# Altium footprint library con-molex.PCBLIB: 369 footprints (part 9 of 26)
Each footprint in its own frame and in the unit in brackets; x right, y up, seen from the top. Pads: shape width x height; smd on the part's side, far side on the other; paste and mask are expansions set on the pad; w line width, h text height; cw(c..) or ccw(c..) is an arc to the next point about the centre after c.
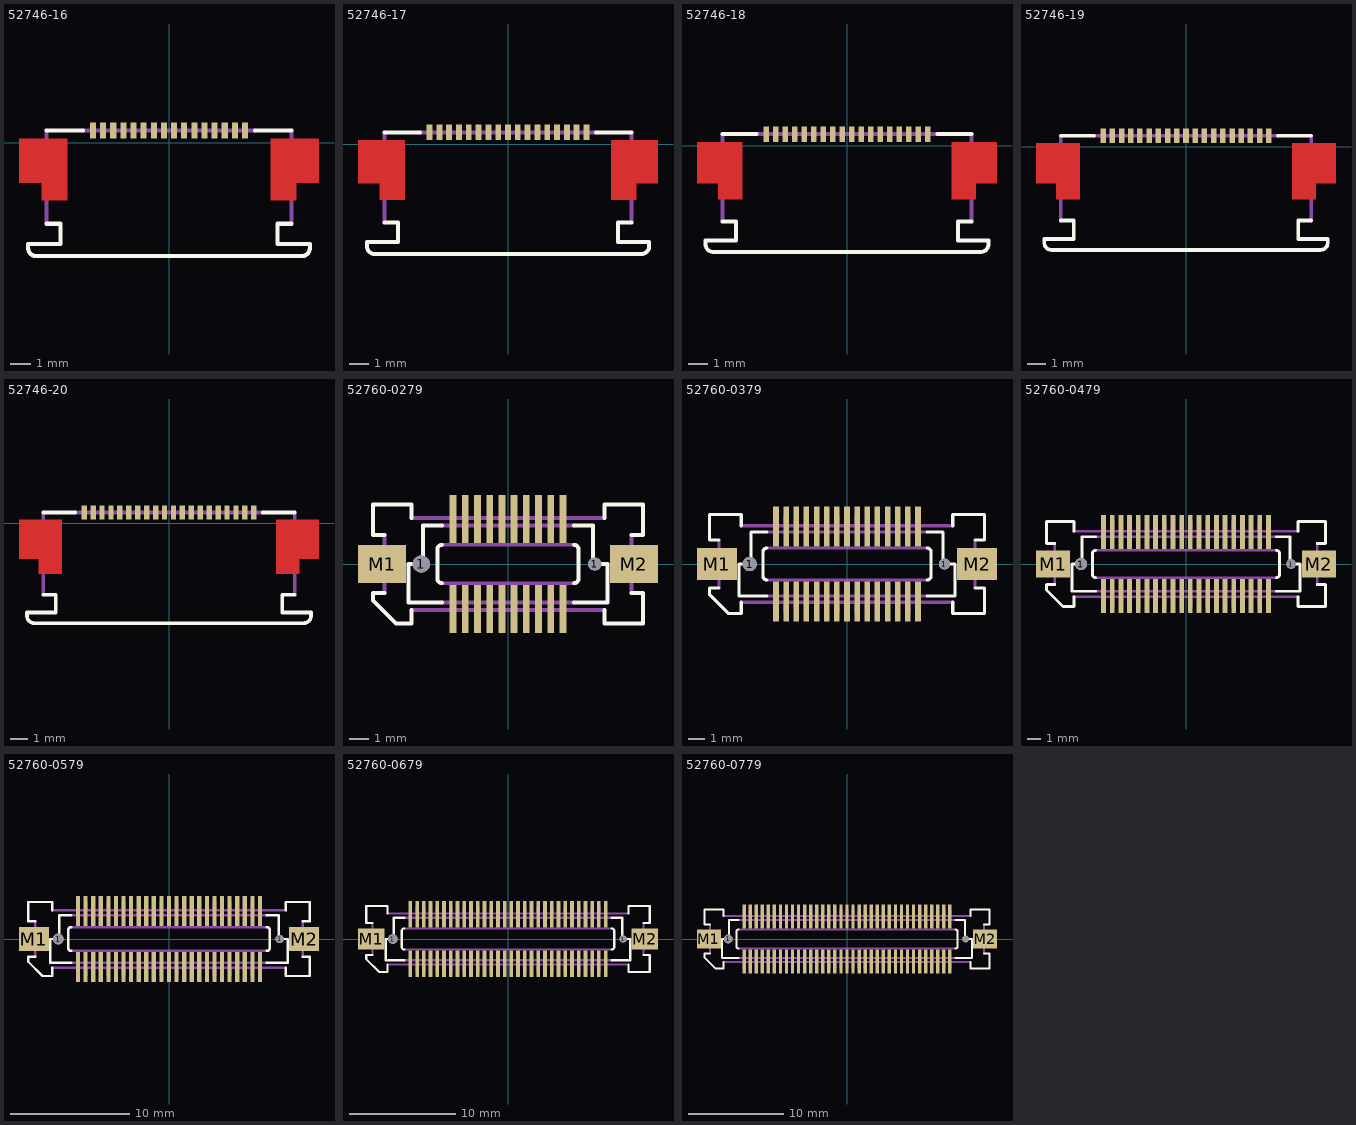
[diagram p8: the footprints below, top view; thin cyan lines are the x and y axes]

## 52746-16 [mil]
pads (16):
  rect 11.81x31.5 smd: 1(-147.64,23.62) 2(-127.95,23.62) 3(-108.27,23.62) 4(-88.58,23.62) 5(-68.9,23.62) 6(-49.21,23.62) 7(-29.53,23.62) 8(-9.84,23.62) 9(9.84,23.62) 10(29.53,23.62) 11(49.21,23.62) 12(68.9,23.62) 13(88.58,23.62) 14(108.27,23.62) 15(127.95,23.62) 16(147.64,23.62)
Top Layer:
  rectangle: -291.34,-78.74 -196.85,7.87
  rectangle: -248.03,-112.2 -196.85,-78.74
  rectangle: 196.85,-78.74 291.34,7.87
  rectangle: 196.85,-112.2 248.03,-78.74
Top Overlay:
  lines w8: -238.19,-157.48 -210.63,-157.48 -210.63,-196.85 -273.62,-196.85 -273.62,-204.72 ccw(c-257.87,-204.72) -257.87,-220.47 257.87,-220.47 ccw(c257.87,-204.72) 273.62,-204.72 273.62,-196.85 210.63,-196.85 210.63,-157.48 238.19,-157.48 ; -238.19,23.62 -167.32,23.62 ; 167.32,23.62 238.19,23.62
Top Paste:
  rectangle: -286.42,-74.8 -200.79,2.95
  rectangle: -244.09,-108.27 -200.79,-74.8
  rectangle: 200.79,-74.8 286.42,2.95
  rectangle: 200.79,-108.27 244.09,-74.8
Top Solder:
  rectangle: -291.34,-78.74 -196.85,7.87
  rectangle: -248.03,-112.2 -196.85,-78.74
  rectangle: 196.85,-78.74 291.34,7.87
  rectangle: 196.85,-112.2 248.03,-78.74
  rectangle: -154.53,6.89 -140.75,40.35
  rectangle: -134.84,6.89 -121.06,40.35
  rectangle: -115.16,6.89 -101.38,40.35
  rectangle: -95.47,6.89 -81.69,40.35
  rectangle: -75.79,6.89 -62.01,40.35
  rectangle: -56.1,6.89 -42.32,40.35
  rectangle: -36.42,6.89 -22.64,40.35
  rectangle: -16.73,6.89 -2.95,40.35
  rectangle: 2.95,6.89 16.73,40.35
  rectangle: 22.64,6.89 36.42,40.35
  rectangle: 42.32,6.89 56.1,40.35
  rectangle: 62.01,6.89 75.79,40.35
  rectangle: 81.69,6.89 95.47,40.35
  rectangle: 101.38,6.89 115.16,40.35
  rectangle: 121.06,6.89 134.84,40.35
  rectangle: 140.75,6.89 154.53,40.35
Mechanical 16:
  lines w8: -238.19,-157.48 -238.19,23.62 ; -167.32,23.62 167.32,23.62 ; 238.19,-157.48 238.19,23.62
  lines w19.69: -275.59,-55.12 -244.09,-55.12 -244.09,-9.84 -275.59,-9.84 ; 275.59,-55.12 244.09,-55.12 244.09,-9.84 275.59,-9.84

## 52746-17 [mil]
pads (17):
  rect 11.81x31.5 smd: 1(-157.48,23.62) 2(-137.8,23.62) 3(-118.11,23.62) 4(-98.43,23.62) 5(-78.74,23.62) 6(-59.06,23.62) 7(-39.37,23.62) 8(-19.69,23.62) 9(0,23.62) 10(19.69,23.62) 11(39.37,23.62) 12(59.06,23.62) 13(78.74,23.62) 14(98.43,23.62) 15(118.11,23.62) 16(137.8,23.62) 17(157.48,23.62)
Top Layer:
  rectangle: -301.18,-78.74 -206.69,7.87
  rectangle: -257.87,-112.2 -206.69,-78.74
  rectangle: 206.69,-78.74 301.18,7.87
  rectangle: 206.69,-112.2 257.87,-78.74
Top Overlay:
  lines w8: -248.03,-157.48 -220.47,-157.48 -220.47,-196.85 -283.46,-196.85 -283.46,-204.72 ccw(c-267.71,-204.72) -267.72,-220.47 267.72,-220.47 ccw(c267.71,-204.72) 283.46,-204.72 283.46,-196.85 220.47,-196.85 220.47,-157.48 248.03,-157.48 ; -248.03,23.62 -177.17,23.62 ; 177.17,23.62 248.03,23.62
Top Paste:
  rectangle: -296.26,-74.8 -210.63,2.95
  rectangle: -253.94,-108.27 -210.63,-74.8
  rectangle: 210.63,-74.8 296.26,2.95
  rectangle: 210.63,-108.27 253.94,-74.8
Top Solder:
  rectangle: -301.18,-78.74 -206.69,7.87
  rectangle: -257.87,-112.2 -206.69,-78.74
  rectangle: 206.69,-78.74 301.18,7.87
  rectangle: 206.69,-112.2 257.87,-78.74
  rectangle: -164.37,6.89 -150.59,40.35
  rectangle: -144.69,6.89 -130.91,40.35
  rectangle: -125,6.89 -111.22,40.35
  rectangle: -105.32,6.89 -91.54,40.35
  rectangle: -85.63,6.89 -71.85,40.35
  rectangle: -65.94,6.89 -52.17,40.35
  rectangle: -46.26,6.89 -32.48,40.35
  rectangle: -26.57,6.89 -12.8,40.35
  rectangle: -6.89,6.89 6.89,40.35
  rectangle: 12.8,6.89 26.57,40.35
  rectangle: 32.48,6.89 46.26,40.35
  rectangle: 52.17,6.89 65.94,40.35
  rectangle: 71.85,6.89 85.63,40.35
  rectangle: 91.54,6.89 105.32,40.35
  rectangle: 111.22,6.89 125,40.35
  rectangle: 130.91,6.89 144.69,40.35
  rectangle: 150.59,6.89 164.37,40.35
Mechanical 16:
  lines w8: -248.03,-157.48 -248.03,23.62 ; -177.17,23.62 177.17,23.62 ; 248.03,-157.48 248.03,23.62
  lines w19.69: -285.43,-55.12 -253.94,-55.12 -253.94,-9.84 -285.43,-9.84 ; 285.43,-55.12 253.94,-55.12 253.94,-9.84 285.43,-9.84

## 52746-18 [mil]
pads (18):
  rect 11.81x31.5 smd: 1(-167.32,23.62) 2(-147.64,23.62) 3(-127.95,23.62) 4(-108.27,23.62) 5(-88.58,23.62) 6(-68.9,23.62) 7(-49.21,23.62) 8(-29.53,23.62) 9(-9.84,23.62) 10(9.84,23.62) 11(29.53,23.62) 12(49.21,23.62) 13(68.9,23.62) 14(88.58,23.62) 15(108.27,23.62) 16(127.95,23.62) 17(147.64,23.62) 18(167.32,23.62)
Top Layer:
  rectangle: -311.02,-78.74 -216.54,7.87
  rectangle: -267.72,-112.2 -216.54,-78.74
  rectangle: 216.54,-78.74 311.02,7.87
  rectangle: 216.54,-112.2 267.72,-78.74
Top Overlay:
  lines w8: -257.87,-157.48 -230.32,-157.48 -230.32,-196.85 -293.31,-196.85 -293.31,-204.72 ccw(c-277.56,-204.72) -277.56,-220.47 277.56,-220.47 ccw(c277.56,-204.72) 293.31,-204.72 293.31,-196.85 230.32,-196.85 230.32,-157.48 257.87,-157.48 ; -257.87,23.62 -187.01,23.62 ; 187.01,23.62 257.87,23.62
Top Paste:
  rectangle: -306.1,-74.8 -220.47,2.95
  rectangle: -263.78,-108.27 -220.47,-74.8
  rectangle: 220.47,-74.8 306.1,2.95
  rectangle: 220.47,-108.27 263.78,-74.8
Top Solder:
  rectangle: -311.02,-78.74 -216.54,7.87
  rectangle: -267.72,-112.2 -216.54,-78.74
  rectangle: 216.54,-78.74 311.02,7.87
  rectangle: 216.54,-112.2 267.72,-78.74
  rectangle: -174.21,6.89 -160.43,40.35
  rectangle: -154.53,6.89 -140.75,40.35
  rectangle: -134.84,6.89 -121.06,40.35
  rectangle: -115.16,6.89 -101.38,40.35
  rectangle: -95.47,6.89 -81.69,40.35
  rectangle: -75.79,6.89 -62.01,40.35
  rectangle: -56.1,6.89 -42.32,40.35
  rectangle: -36.42,6.89 -22.64,40.35
  rectangle: -16.73,6.89 -2.95,40.35
  rectangle: 2.95,6.89 16.73,40.35
  rectangle: 22.64,6.89 36.42,40.35
  rectangle: 42.32,6.89 56.1,40.35
  rectangle: 62.01,6.89 75.79,40.35
  rectangle: 81.69,6.89 95.47,40.35
  rectangle: 101.38,6.89 115.16,40.35
  rectangle: 121.06,6.89 134.84,40.35
  rectangle: 140.75,6.89 154.53,40.35
  rectangle: 160.43,6.89 174.21,40.35
Mechanical 16:
  lines w8: -257.87,-157.48 -257.87,23.62 ; -187.01,23.62 187.01,23.62 ; 257.87,-157.48 257.87,23.62
  lines w19.69: -295.28,-55.12 -263.78,-55.12 -263.78,-9.84 -295.28,-9.84 ; 295.28,-55.12 263.78,-55.12 263.78,-9.84 295.28,-9.84

## 52746-19 [mil]
pads (19):
  rect 11.81x31.5 smd: 1(-177.17,23.62) 2(-157.48,23.62) 3(-137.8,23.62) 4(-118.11,23.62) 5(-98.43,23.62) 6(-78.74,23.62) 7(-59.06,23.62) 8(-39.37,23.62) 9(-19.69,23.62) 10(0,23.62) 11(19.69,23.62) 12(39.37,23.62) 13(59.06,23.62) 14(78.74,23.62) 15(98.43,23.62) 16(118.11,23.62) 17(137.8,23.62) 18(157.48,23.62) 19(177.17,23.62)
Top Layer:
  rectangle: -320.87,-78.74 -226.38,7.87
  rectangle: -277.56,-112.2 -226.38,-78.74
  rectangle: 226.38,-78.74 320.87,7.87
  rectangle: 226.38,-112.2 277.56,-78.74
Top Overlay:
  lines w8: -267.72,-157.48 -240.16,-157.48 -240.16,-196.85 -303.15,-196.85 -303.15,-204.72 ccw(c-287.4,-204.72) -287.4,-220.47 287.4,-220.47 ccw(c287.4,-204.72) 303.15,-204.72 303.15,-196.85 240.16,-196.85 240.16,-157.48 267.72,-157.48 ; -267.72,23.62 -196.85,23.62 ; 196.85,23.62 267.72,23.62
Top Paste:
  rectangle: -315.94,-74.8 -230.32,2.95
  rectangle: -273.62,-108.27 -230.32,-74.8
  rectangle: 230.32,-74.8 315.94,2.95
  rectangle: 230.32,-108.27 273.62,-74.8
Top Solder:
  rectangle: -320.87,-78.74 -226.38,7.87
  rectangle: -277.56,-112.2 -226.38,-78.74
  rectangle: 226.38,-78.74 320.87,7.87
  rectangle: 226.38,-112.2 277.56,-78.74
  rectangle: -184.06,6.89 -170.28,40.35
  rectangle: -164.37,6.89 -150.59,40.35
  rectangle: -144.69,6.89 -130.91,40.35
  rectangle: -125,6.89 -111.22,40.35
  rectangle: -105.32,6.89 -91.54,40.35
  rectangle: -85.63,6.89 -71.85,40.35
  rectangle: -65.94,6.89 -52.17,40.35
  rectangle: -46.26,6.89 -32.48,40.35
  rectangle: -26.57,6.89 -12.8,40.35
  rectangle: -6.89,6.89 6.89,40.35
  rectangle: 12.8,6.89 26.57,40.35
  rectangle: 32.48,6.89 46.26,40.35
  rectangle: 52.17,6.89 65.94,40.35
  rectangle: 71.85,6.89 85.63,40.35
  rectangle: 91.54,6.89 105.32,40.35
  rectangle: 111.22,6.89 125,40.35
  rectangle: 130.91,6.89 144.69,40.35
  rectangle: 150.59,6.89 164.37,40.35
  rectangle: 170.28,6.89 184.06,40.35
Mechanical 16:
  lines w8: -267.72,-157.48 -267.72,23.62 ; -196.85,23.62 196.85,23.62 ; 267.72,-157.48 267.72,23.62
  lines w19.69: -305.12,-55.12 -273.62,-55.12 -273.62,-9.84 -305.12,-9.84 ; 305.12,-55.12 273.62,-55.12 273.62,-9.84 305.12,-9.84

## 52746-20 [mil]
pads (20):
  rect 11.81x31.5 smd: 1(-187.01,23.62) 2(-167.32,23.62) 3(-147.64,23.62) 4(-127.95,23.62) 5(-108.27,23.62) 6(-88.58,23.62) 7(-68.9,23.62) 8(-49.21,23.62) 9(-29.53,23.62) 10(-9.84,23.62) 11(9.84,23.62) 12(29.53,23.62) 13(49.21,23.62) 14(68.9,23.62) 15(88.58,23.62) 16(108.27,23.62) 17(127.95,23.62) 18(147.64,23.62) 19(167.32,23.62) 20(187.01,23.62)
Top Layer:
  rectangle: -330.71,-78.74 -236.22,7.87
  rectangle: -287.4,-112.2 -236.22,-78.74
  rectangle: 236.22,-78.74 330.71,7.87
  rectangle: 236.22,-112.2 287.4,-78.74
Top Overlay:
  lines w8: -277.56,-157.48 -250,-157.48 -250,-196.85 -312.99,-196.85 -312.99,-204.72 ccw(c-297.24,-204.72) -297.24,-220.47 297.24,-220.47 ccw(c297.24,-204.72) 312.99,-204.72 312.99,-196.85 250,-196.85 250,-157.48 277.56,-157.48 ; -277.56,23.62 -206.69,23.62 ; 206.69,23.62 277.56,23.62
Top Paste:
  rectangle: -325.79,-74.8 -240.16,2.95
  rectangle: -283.46,-108.27 -240.16,-74.8
  rectangle: 240.16,-74.8 325.79,2.95
  rectangle: 240.16,-108.27 283.46,-74.8
Top Solder:
  rectangle: -330.71,-78.74 -236.22,7.87
  rectangle: -287.4,-112.2 -236.22,-78.74
  rectangle: 236.22,-78.74 330.71,7.87
  rectangle: 236.22,-112.2 287.4,-78.74
  rectangle: -193.9,6.89 -180.12,40.35
  rectangle: -174.21,6.89 -160.43,40.35
  rectangle: -154.53,6.89 -140.75,40.35
  rectangle: -134.84,6.89 -121.06,40.35
  rectangle: -115.16,6.89 -101.38,40.35
  rectangle: -95.47,6.89 -81.69,40.35
  rectangle: -75.79,6.89 -62.01,40.35
  rectangle: -56.1,6.89 -42.32,40.35
  rectangle: -36.42,6.89 -22.64,40.35
  rectangle: -16.73,6.89 -2.95,40.35
  rectangle: 2.95,6.89 16.73,40.35
  rectangle: 22.64,6.89 36.42,40.35
  rectangle: 42.32,6.89 56.1,40.35
  rectangle: 62.01,6.89 75.79,40.35
  rectangle: 81.69,6.89 95.47,40.35
  rectangle: 101.38,6.89 115.16,40.35
  rectangle: 121.06,6.89 134.84,40.35
  rectangle: 140.75,6.89 154.53,40.35
  rectangle: 160.43,6.89 174.21,40.35
  rectangle: 180.12,6.89 193.9,40.35
Mechanical 16:
  lines w8: -277.56,-157.48 -277.56,23.62 ; -206.69,23.62 206.69,23.62 ; 277.56,-157.48 277.56,23.62
  lines w19.69: -314.96,-55.12 -283.46,-55.12 -283.46,-9.84 -314.96,-9.84 ; 314.96,-55.12 283.46,-55.12 283.46,-9.84 314.96,-9.84

## 52760-0279 [mm]
pads (24):
  round 0.9 hole 0.9: 1(-4.51,0)
  rect 0.35x2.5 smd: 1(-2.857,-2.35) 2(-2.857,2.35) 3(-2.222,-2.35) 4(-2.222,2.35) 5(-1.587,-2.35) 6(-1.587,2.35) 7(-0.953,-2.35) 8(-0.953,2.35) 9(-0.318,-2.35) 10(-0.318,2.35) 11(0.318,-2.35) 12(0.318,2.35) 13(0.953,-2.35) 14(0.953,2.35) 15(1.587,-2.35) 16(1.587,2.35) 17(2.222,-2.35) 18(2.222,2.35) 19(2.857,-2.35) 20(2.857,2.35)
  round 0.7 hole 0.7: 1(4.51,0)
  rect 2.5x2 smd: M1(-6.55,0) M2(6.55,0)
Top Overlay:
  lines w0.203: -6.425,-1.5 -7.025,-1.5 -7.025,-1.9 -5.825,-3.1 -5.025,-3.1 -5.025,-2.4 ; -6.425,1.5 -7.025,1.5 -7.025,3.1 -5.025,3.1 -5.025,2.4 ; -3.425,-2 -5.175,-2 -5.175,0 -4.425,0 -4.425,2 -3.425,2 ; -3.425,-1 cw(c-3.425,-0.75) -3.675,-0.75 -3.675,0.75 cw(c-3.425,0.75) -3.425,1 ; 3.425,-2 5.175,-2 5.175,0 4.425,0 4.425,2 3.425,2 ; 3.425,-1 ccw(c3.425,-0.75) 3.675,-0.75 3.675,0.75 ccw(c3.425,0.75) 3.425,1 ; 5.025,-2.4 5.025,-3.1 7.025,-3.1 7.025,-1.5 6.425,-1.5 ; 5.025,2.4 5.025,3.1 7.025,3.1 7.025,1.5 6.425,1.5
Top Solder:
  rectangle: -3.057,-3.625 -2.658,-1.075
  region: -2.658,3.625 -3.057,3.625 -3.057,1.075 -2.658,1.075
  rectangle: -2.422,-3.625 -2.023,-1.075
  region: -2.023,3.625 -2.422,3.625 -2.422,1.075 -2.023,1.075
  rectangle: -1.787,-3.625 -1.388,-1.075
  region: -1.388,3.625 -1.787,3.625 -1.787,1.075 -1.388,1.075
  rectangle: -1.152,-3.625 -0.753,-1.075
  region: -0.753,3.625 -1.152,3.625 -1.152,1.075 -0.753,1.075
  rectangle: -0.517,-3.625 -0.118,-1.075
  region: -0.118,3.625 -0.517,3.625 -0.517,1.075 -0.118,1.075
  rectangle: 0.118,-3.625 0.517,-1.075
  region: 0.517,3.625 0.118,3.625 0.118,1.075 0.517,1.075
  rectangle: 0.753,-3.625 1.152,-1.075
  region: 1.152,3.625 0.753,3.625 0.753,1.075 1.152,1.075
  rectangle: 1.388,-3.625 1.787,-1.075
  region: 1.787,3.625 1.388,3.625 1.388,1.075 1.787,1.075
  rectangle: 2.023,-3.625 2.422,-1.075
  region: 2.422,3.625 2.023,3.625 2.023,1.075 2.422,1.075
  rectangle: 2.658,-3.625 3.057,-1.075
  region: 3.057,3.625 2.658,3.625 2.658,1.075 3.057,1.075
Mechanical 16:
  rectangle: -3.008,-3.1 -2.707,-2.375
  region: -2.707,3.1 -3.008,3.1 -3.008,2.375 -2.707,2.375
  rectangle: -2.373,-3.1 -2.072,-2.375
  region: -2.072,3.1 -2.373,3.1 -2.373,2.375 -2.072,2.375
  rectangle: -1.738,-3.1 -1.437,-2.375
  region: -1.437,3.1 -1.738,3.1 -1.738,2.375 -1.437,2.375
  rectangle: -1.103,-3.1 -0.802,-2.375
  region: -0.802,3.1 -1.103,3.1 -1.103,2.375 -0.802,2.375
  rectangle: -0.468,-3.1 -0.167,-2.375
  region: -0.167,3.1 -0.468,3.1 -0.468,2.375 -0.167,2.375
  rectangle: 0.167,-3.1 0.468,-2.375
  region: 0.468,3.1 0.167,3.1 0.167,2.375 0.468,2.375
  rectangle: 0.802,-3.1 1.103,-2.375
  region: 1.103,3.1 0.802,3.1 0.802,2.375 1.103,2.375
  rectangle: 1.437,-3.1 1.738,-2.375
  region: 1.738,3.1 1.437,3.1 1.437,2.375 1.738,2.375
  rectangle: 2.072,-3.1 2.373,-2.375
  region: 2.373,3.1 2.072,3.1 2.072,2.375 2.373,2.375
  rectangle: 2.707,-3.1 3.008,-2.375
  region: 3.008,3.1 2.707,3.1 2.707,2.375 3.008,2.375
  lines w0.203: -6.425,-1.5 -6.425,1.5 ; -5.025,-2.4 5.025,-2.4 ; -5.025,2.4 5.025,2.4 ; -3.425,-2 3.425,-2 ; -3.425,-1 3.425,-1 ; -3.425,1 3.425,1 ; -3.425,2 3.425,2 ; 6.425,-1.5 6.425,1.5

## 52760-0379 [mm]
pads (34):
  round 0.9 hole 0.9: 1(-6.098,0)
  rect 0.35x2.5 smd: 1(-4.445,-2.35) 2(-4.445,2.35) 3(-3.81,-2.35) 4(-3.81,2.35) 5(-3.175,-2.35) 6(-3.175,2.35) 7(-2.54,-2.35) 8(-2.54,2.35) 9(-1.905,-2.35) 10(-1.905,2.35) 11(-1.27,-2.35) 12(-1.27,2.35) 13(-0.635,-2.35) 14(-0.635,2.35) 15(0,-2.35) 16(0,2.35) 17(0.635,-2.35) 18(0.635,2.35) 19(1.27,-2.35) 20(1.27,2.35) 21(1.905,-2.35) 22(1.905,2.35) 23(2.54,-2.35) 24(2.54,2.35) 25(3.175,-2.35) 26(3.175,2.35) 27(3.81,-2.35) 28(3.81,2.35) 29(4.445,-2.35) 30(4.445,2.35)
  round 0.7 hole 0.7: 1(6.098,0)
  rect 2.5x2 smd: M1(-8.137,0) M2(8.137,0)
Top Overlay:
  lines w0.203: -8.012,-1.5 -8.612,-1.5 -8.612,-1.9 -7.412,-3.1 -6.612,-3.1 -6.612,-2.4 ; -8.012,1.5 -8.612,1.5 -8.612,3.1 -6.612,3.1 -6.612,2.4 ; -5.012,-2 -6.762,-2 -6.762,0 -6.012,0 -6.012,2 -5.012,2 ; -5.012,-1 cw(c-5.013,-0.75) -5.263,-0.75 -5.263,0.75 cw(c-5.013,0.75) -5.012,1 ; 5.012,-2 6.762,-2 6.762,0 6.012,0 6.012,2 5.012,2 ; 5.012,-1 ccw(c5.013,-0.75) 5.263,-0.75 5.263,0.75 ccw(c5.013,0.75) 5.012,1 ; 6.612,-2.4 6.612,-3.1 8.612,-3.1 8.612,-1.5 8.012,-1.5 ; 6.612,2.4 6.612,3.1 8.612,3.1 8.612,1.5 8.012,1.5
Top Solder:
  region: 4.645,3.625 4.245,3.625 4.245,1.075 4.645,1.075
  rectangle: 4.245,-3.625 4.645,-1.075
  region: 4.01,3.625 3.61,3.625 3.61,1.075 4.01,1.075
  rectangle: 3.61,-3.625 4.01,-1.075
  region: 3.375,3.625 2.975,3.625 2.975,1.075 3.375,1.075
  rectangle: 2.975,-3.625 3.375,-1.075
  region: 2.74,3.625 2.34,3.625 2.34,1.075 2.74,1.075
  rectangle: 2.34,-3.625 2.74,-1.075
  region: 2.105,3.625 1.705,3.625 1.705,1.075 2.105,1.075
  rectangle: 1.705,-3.625 2.105,-1.075
  region: 1.47,3.625 1.07,3.625 1.07,1.075 1.47,1.075
  rectangle: 1.07,-3.625 1.47,-1.075
  region: 0.835,3.625 0.435,3.625 0.435,1.075 0.835,1.075
  rectangle: 0.435,-3.625 0.835,-1.075
  region: 0.2,3.625 -0.2,3.625 -0.2,1.075 0.2,1.075
  rectangle: -0.2,-3.625 0.2,-1.075
  region: -0.435,3.625 -0.835,3.625 -0.835,1.075 -0.435,1.075
  rectangle: -0.835,-3.625 -0.435,-1.075
  region: -1.07,3.625 -1.47,3.625 -1.47,1.075 -1.07,1.075
  rectangle: -1.47,-3.625 -1.07,-1.075
  region: -1.705,3.625 -2.105,3.625 -2.105,1.075 -1.705,1.075
  rectangle: -2.105,-3.625 -1.705,-1.075
  region: -2.34,3.625 -2.74,3.625 -2.74,1.075 -2.34,1.075
  rectangle: -2.74,-3.625 -2.34,-1.075
  region: -2.975,3.625 -3.375,3.625 -3.375,1.075 -2.975,1.075
  rectangle: -3.375,-3.625 -2.975,-1.075
  region: -3.61,3.625 -4.01,3.625 -4.01,1.075 -3.61,1.075
  rectangle: -4.01,-3.625 -3.61,-1.075
  region: -4.245,3.625 -4.645,3.625 -4.645,1.075 -4.245,1.075
  rectangle: -4.645,-3.625 -4.245,-1.075
Mechanical 16:
  region: 4.595,3.1 4.295,3.1 4.295,2.375 4.595,2.375
  rectangle: 4.295,-3.1 4.595,-2.375
  region: 3.96,3.1 3.66,3.1 3.66,2.375 3.96,2.375
  rectangle: 3.66,-3.1 3.96,-2.375
  region: 3.325,3.1 3.025,3.1 3.025,2.375 3.325,2.375
  rectangle: 3.025,-3.1 3.325,-2.375
  region: 2.69,3.1 2.39,3.1 2.39,2.375 2.69,2.375
  rectangle: 2.39,-3.1 2.69,-2.375
  region: 2.055,3.1 1.755,3.1 1.755,2.375 2.055,2.375
  rectangle: 1.755,-3.1 2.055,-2.375
  region: 1.42,3.1 1.12,3.1 1.12,2.375 1.42,2.375
  rectangle: 1.12,-3.1 1.42,-2.375
  region: 0.785,3.1 0.485,3.1 0.485,2.375 0.785,2.375
  rectangle: 0.485,-3.1 0.785,-2.375
  region: 0.15,3.1 -0.15,3.1 -0.15,2.375 0.15,2.375
  rectangle: -0.15,-3.1 0.15,-2.375
  region: -0.485,3.1 -0.785,3.1 -0.785,2.375 -0.485,2.375
  rectangle: -0.785,-3.1 -0.485,-2.375
  region: -1.12,3.1 -1.42,3.1 -1.42,2.375 -1.12,2.375
  rectangle: -1.42,-3.1 -1.12,-2.375
  region: -1.755,3.1 -2.055,3.1 -2.055,2.375 -1.755,2.375
  rectangle: -2.055,-3.1 -1.755,-2.375
  region: -2.39,3.1 -2.69,3.1 -2.69,2.375 -2.39,2.375
  rectangle: -2.69,-3.1 -2.39,-2.375
  region: -3.025,3.1 -3.325,3.1 -3.325,2.375 -3.025,2.375
  rectangle: -3.325,-3.1 -3.025,-2.375
  region: -3.66,3.1 -3.96,3.1 -3.96,2.375 -3.66,2.375
  rectangle: -3.96,-3.1 -3.66,-2.375
  region: -4.295,3.1 -4.595,3.1 -4.595,2.375 -4.295,2.375
  rectangle: -4.595,-3.1 -4.295,-2.375
  lines w0.203: -8.012,-1.5 -8.012,1.5 ; -6.612,-2.4 6.612,-2.4 ; -6.612,2.4 6.612,2.4 ; -5.012,-2 5.012,-2 ; -5.012,-1 5.012,-1 ; -5.012,1 5.012,1 ; -5.012,2 5.012,2 ; 8.012,-1.5 8.012,1.5

## 52760-0479 [mm]
pads (44):
  round 0.9 hole 0.9: 1(-7.685,0)
  rect 0.35x2.5 smd: 1(-6.032,-2.35) 2(-6.032,2.35) 3(-5.397,-2.35) 4(-5.397,2.35) 5(-4.763,-2.35) 6(-4.763,2.35) 7(-4.127,-2.35) 8(-4.127,2.35) 9(-3.492,-2.35) 10(-3.492,2.35) 11(-2.857,-2.35) 12(-2.857,2.35) 13(-2.222,-2.35) 14(-2.222,2.35) 15(-1.587,-2.35) 16(-1.587,2.35) 17(-0.953,-2.35) 18(-0.953,2.35) 19(-0.318,-2.35) 20(-0.318,2.35) 21(0.318,-2.35) 22(0.318,2.35) 23(0.953,-2.35) 24(0.953,2.35) 25(1.587,-2.35) 26(1.587,2.35) 27(2.222,-2.35) 28(2.222,2.35) 29(2.857,-2.35) 30(2.857,2.35) 31(3.492,-2.35) 32(3.492,2.35) 33(4.127,-2.35) 34(4.127,2.35) 35(4.763,-2.35) 36(4.763,2.35) 37(5.397,-2.35) 38(5.397,2.35) 39(6.032,-2.35) 40(6.032,2.35)
  round 0.7 hole 0.7: 1(7.685,0)
  rect 2.5x2 smd: M1(-9.725,0) M2(9.725,0)
Top Overlay:
  lines w0.203: -9.6,-1.5 -10.2,-1.5 -10.2,-1.9 -9,-3.1 -8.2,-3.1 -8.2,-2.4 ; -9.6,1.5 -10.2,1.5 -10.2,3.1 -8.2,3.1 -8.2,2.4 ; -6.6,-2 -8.35,-2 -8.35,0 -7.6,0 -7.6,2 -6.6,2 ; -6.6,-1 cw(c-6.6,-0.75) -6.85,-0.75 -6.85,0.75 cw(c-6.6,0.75) -6.6,1 ; 6.6,-2 8.35,-2 8.35,0 7.6,0 7.6,2 6.6,2 ; 6.6,-1 ccw(c6.6,-0.75) 6.85,-0.75 6.85,0.75 ccw(c6.6,0.75) 6.6,1 ; 8.2,-2.4 8.2,-3.1 10.2,-3.1 10.2,-1.5 9.6,-1.5 ; 8.2,2.4 8.2,3.1 10.2,3.1 10.2,1.5 9.6,1.5
Top Solder:
  rectangle: -6.232,-3.625 -5.833,-1.075
  region: -5.833,3.625 -6.232,3.625 -6.232,1.075 -5.833,1.075
  rectangle: -5.597,-3.625 -5.198,-1.075
  region: -5.198,3.625 -5.597,3.625 -5.597,1.075 -5.198,1.075
  rectangle: -4.962,-3.625 -4.563,-1.075
  region: -4.563,3.625 -4.962,3.625 -4.962,1.075 -4.563,1.075
  rectangle: -4.327,-3.625 -3.928,-1.075
  region: -3.928,3.625 -4.327,3.625 -4.327,1.075 -3.928,1.075
  rectangle: -3.692,-3.625 -3.293,-1.075
  region: -3.293,3.625 -3.692,3.625 -3.692,1.075 -3.293,1.075
  rectangle: -3.057,-3.625 -2.658,-1.075
  region: -2.658,3.625 -3.057,3.625 -3.057,1.075 -2.658,1.075
  rectangle: -2.422,-3.625 -2.023,-1.075
  region: -2.023,3.625 -2.422,3.625 -2.422,1.075 -2.023,1.075
  rectangle: -1.787,-3.625 -1.388,-1.075
  region: -1.388,3.625 -1.787,3.625 -1.787,1.075 -1.388,1.075
  rectangle: -1.152,-3.625 -0.753,-1.075
  region: -0.753,3.625 -1.152,3.625 -1.152,1.075 -0.753,1.075
  rectangle: -0.517,-3.625 -0.118,-1.075
  region: -0.118,3.625 -0.517,3.625 -0.517,1.075 -0.118,1.075
  rectangle: 0.118,-3.625 0.517,-1.075
  region: 0.517,3.625 0.118,3.625 0.118,1.075 0.517,1.075
  rectangle: 0.753,-3.625 1.152,-1.075
  region: 1.152,3.625 0.753,3.625 0.753,1.075 1.152,1.075
  rectangle: 1.388,-3.625 1.787,-1.075
  region: 1.787,3.625 1.388,3.625 1.388,1.075 1.787,1.075
  rectangle: 2.023,-3.625 2.422,-1.075
  region: 2.422,3.625 2.023,3.625 2.023,1.075 2.422,1.075
  rectangle: 2.658,-3.625 3.057,-1.075
  region: 3.057,3.625 2.658,3.625 2.658,1.075 3.057,1.075
  rectangle: 3.293,-3.625 3.692,-1.075
  region: 3.692,3.625 3.293,3.625 3.293,1.075 3.692,1.075
  rectangle: 3.928,-3.625 4.327,-1.075
  region: 4.327,3.625 3.928,3.625 3.928,1.075 4.327,1.075
  rectangle: 4.563,-3.625 4.962,-1.075
  region: 4.962,3.625 4.563,3.625 4.563,1.075 4.962,1.075
  rectangle: 5.198,-3.625 5.597,-1.075
  region: 5.597,3.625 5.198,3.625 5.198,1.075 5.597,1.075
  rectangle: 5.833,-3.625 6.232,-1.075
  region: 6.232,3.625 5.833,3.625 5.833,1.075 6.232,1.075
Mechanical 16:
  rectangle: -6.183,-3.1 -5.882,-2.375
  region: -5.882,3.1 -6.183,3.1 -6.183,2.375 -5.882,2.375
  rectangle: -5.548,-3.1 -5.247,-2.375